# Altium footprint library JL_PCB.PCBLIB: 1112 footprints (part 69 of 71)
Each footprint in its own frame and in the unit in brackets; x right, y up, seen from the top. Pads: shape width x height; smd on the part's side, far side on the other; paste and mask are expansions set on the pad; w line width, h text height; cw(c..) or ccw(c..) is an arc to the next point about the centre after c.
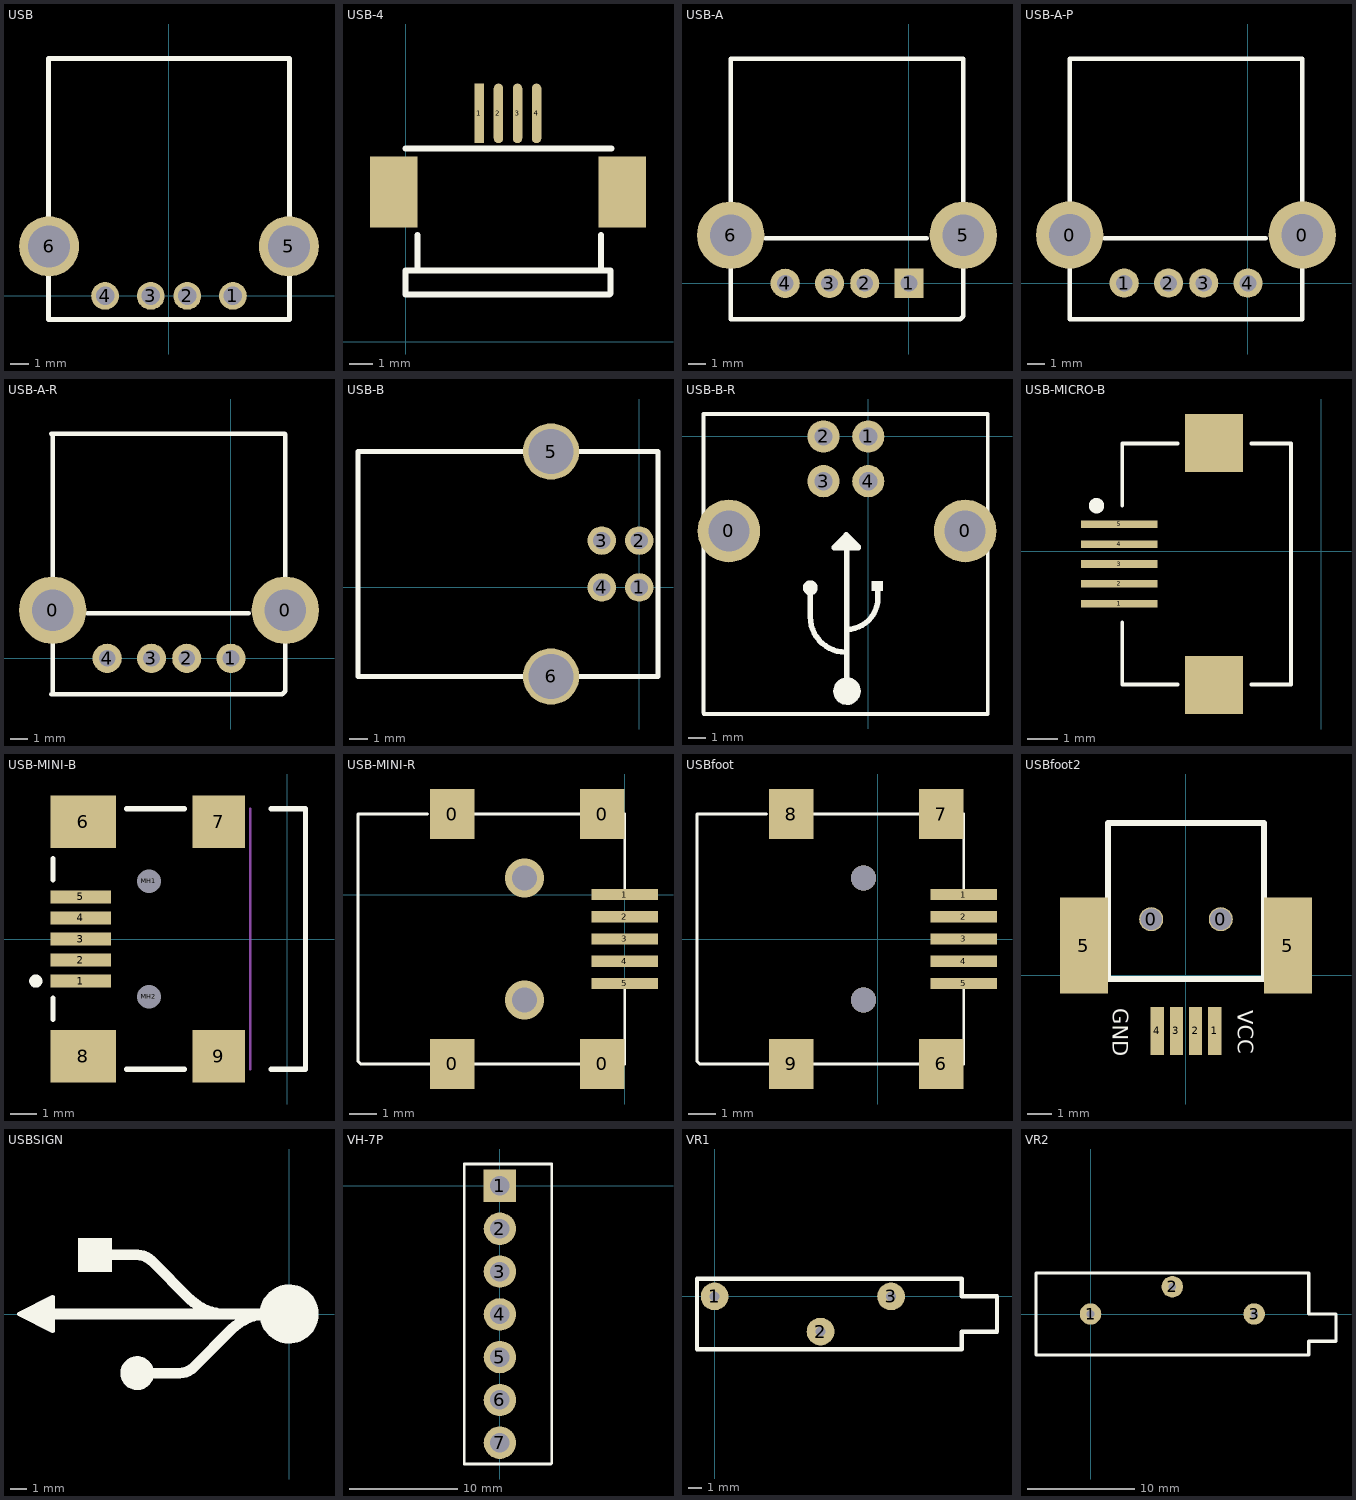
[diagram p68: the footprints below, top view; thin cyan lines are the x and y axes]

## USB [mm]
pads (6):
  round 1.524 hole 1: 1(3.503,0) 2(1.003,0) 3(-0.997,0) 4(-3.497,0)
  round 3.3 hole 2.3: 5(6.573,2.71) 6(-6.567,2.71)
TopOverlay:
  lines w0.254: -6.597,-1.295 6.603,-1.295 6.603,13.005 -6.597,13.005 -6.597,-1.295

## USB-4 [mm]
pads (6):
  rect 0.4x2.5 smd: 1(3.1,9.6)
  oval 0.4x2.5 smd: 2(3.9,9.6) 3(4.7,9.6) 4(5.5,9.6)
  rect 2x3 smd: ""(-0.5,6.3) ""(9.1,6.3)
TopOverlay:
  lines w0.254: 0,8.128 8.636,8.128 ; 0.5,3 0.5,4.5 ; 8.2,3 8.2,4.5 ; 0,2 0,3 8.6,3 8.6,2.036 8.564,2 0,2

## USB-A [mil]
pads (6):
  rect 65x65 hole 37: 1(0,0)
  round 65 hole 37: 2(-98.5,0) 3(-177,0) 4(-275.6,0)
  round 150 hole 93: 5(121,107) 6(-397,107)
TopOverlay:
  lines w10: -320,100 40,100 ; -397,-80 114,-80 121,-73 121,107 121,500 -397,500 -397,107 -397,-80
3D body "User Library-USB-A-01.step": height 274.23, standoff -164.75, extent -449.02,-45 173.02,494.37

## USB-A-P [mil]
pads (6):
  round 150 hole 93: 0(-397,107) 0(121,107)
  round 65 hole 37: 1(-275.6,0) 2(-177,0) 3(-98.5,0) 4(0,0)
TopOverlay:
  lines w10: -320,100 40,100 ; -397,-80 -397,107 -397,499 121,499 121,107 121,-80 -397,-80

## USB-A-R [mil]
pads (6):
  round 150 hole 93: 0(-397,107) 0(121,107)
  round 65 hole 37: 1(0,0) 2(-98.5,0) 3(-177,0) 4(-275.6,0)
TopOverlay:
  lines w10: -400,-80 114,-80 121,-73 121,107 121,499 120,500 -400,500 -397,497 -397,477 -397,107 -397,-77 ; -320,100 40,100

## USB-B [mm]
pads (6):
  round 1.524 hole 0.92: 1(0,0) 2(0,2.5) 3(-2,2.5) 4(-2,0)
  round 3 hole 2.4: 5(-4.7,7.25) 6(-4.7,-4.75)
TopOverlay:
  lines w0.254: -15,-4.75 1,-4.75 1,7.25 -15,7.25 -15,-4.75

## USB-B-R [mm]
pads (6):
  round 3.5 hole 2.3: 0(-7.789,-5.281) 0(5.411,-5.281)
  round 1.8 hole 1.016: 1(0,0) 2(-2.5,0) 3(-2.5,-2.5) 4(0,-2.5)
TopOverlay:
  rectangle: -1.514,-14.706 -0.814,-13.756
  rectangle: -3.339,-8.531 -3.139,-8.331
  rectangle: 0.186,-8.631 0.836,-8.081
  lines w0.203: -9.206,-15.432 -9.206,1.256 6.669,1.256 6.669,-15.508 ; -9.189,0.169 -9.189,-15.506 6.686,-15.506 6.686,0.169 ; -9.114,1.236 6.686,1.236
  lines w0.305: -3.239,-8.581 -3.239,-10.081 ccw(c-1.264,-10.081) -1.264,-12.056 ; -3.025,-8.605 cw(c-3.239,-8.456) -2.989,-8.532 ; -1.914,-6.206 -0.564,-6.206 -0.814,-5.956 -1.639,-5.956 ; -1.889,-6.181 -1.214,-5.506 -1.214,-13.981 ; -1.614,-13.906 ccw(c-1.214,-14.156) -1.564,-13.84 ; -1.516,-13.707 ccw(c-1.189,-14.231) -1.469,-13.681 ; -1.239,-5.756 -1.239,-5.481 -0.564,-6.156 ; -1.214,-10.781 ccw(c-1.214,-9.031) 0.536,-9.031 0.536,-8.681 ; -1.09,-13.979 ccw(c-1.264,-14.106) -1.05,-14.079

## USB-MICRO-B [mm] "Connector; USB2.0, Type A, SM; 5 Position; Right Angle"
height 3.9
pads (7):
  rect 2.5x0.25 smd: 1(-6.6,-1.719) 2(-6.6,-1.069) 3(-6.6,-0.419) 4(-6.6,0.231) 5(-6.6,0.881)
  rect 1.9x1.9 smd: ""(-3.505,-4.369) ""(-3.505,3.531)
TopOverlay:
  circle w0.25: c-7.348,1.486 r0.125
  lines w0.127: -6.508,-4.356 -4.7,-4.356 ; -6.508,-4.319 -6.508,-2.324 ; -6.508,1.486 -6.508,3.481 ; -6.508,3.518 -4.7,3.518 ; -2.286,-4.356 -1,-4.356 ; -2.286,3.518 -1,3.518 ; -1,-4.319 -1,3.481
3D body "Micro USB.STP": height 2.71, standoff -0.23, extent -6.358,-4.422 -0.928,3.558

## USB-MINI-B [mm] "Connector; USB2.0, Type A, SM; 5 Position; Right Angle"
height 3.9
pads (11):
  rect 2.3x0.5 smd: 1(-7.85,-1.6) 2(-7.85,-0.8) 3(-7.85,0) 4(-7.85,0.8) 5(-7.85,1.6)
  rect 2.5x2 smd: 6(-7.75,4.45) 8(-7.75,-4.45)
  rect 2x2 smd: 7(-2.6,4.45) 9(-2.6,-4.45)
  round 0.6 hole 0.9 unplated: MH1(-5.25,2.2) MH2(-5.25,-2.2)
TopOverlay:
  circle w0.25: c-9.55,-1.6 r0.125
  lines w0.2: -8.9,-3.05 -8.9,-2.25 ; -8.9,2.25 -8.9,3.05 ; -6.1,-4.95 -3.9,-4.95 ; -6.1,4.95 -3.9,4.95 ; -0.6,-4.95 0.7,-4.95 0.7,4.95 -0.6,4.95
Mechanical1:
  lines w0.1: -1.4,-4.95 -1.4,4.95
  text "PCB Edge" at 0.432,-4.036 h0.25
3D body "User Library-USB_mini_B.STEP": height 3.95, standoff -1, extent -8.55,-5.35 0.65,5.35

## USB-MINI-R [mm]
pads (9):
  rect 1.6x1.8 smd: 0(-6.2,-6.1) 0(-6.2,2.9) 0(-0.8,-6.1) 0(-0.8,2.9)
  rect 2.4x0.4 smd: 1(0,0) 2(0,-0.8) 3(0,-1.6) 4(0,-2.4) 5(0,-3.2)
via -3.6,0.6 diameter 1.4 hole 0.9
via -3.6,-3.8 diameter 1.4 hole 0.9
TopOverlay:
  lines w0.1: -7.1,2.9 -9.6,2.9 -9.6,-6 -9.5,-6.1 -7,-6.1 ; -5.4,-6.1 -1.6,-6.1 ; -5.4,2.9 -1.6,2.9 ; 0,-6.1 0,-3.4 ; 0,0.2 0,2.9

## USBfoot [mm]
pads (9):
  rect 2.4x0.4 smd: 1(3.1,1.6) 2(3.1,0.8) 3(3.1,0) 4(3.1,-0.8) 5(3.1,-1.6)
  rect 1.6x1.8 smd: 6(2.3,-4.5) 7(2.3,4.5) 8(-3.1,4.5) 9(-3.1,-4.5)
via -0.5,2.2 diameter 0.9 hole 0.9
via -0.5,-2.2 diameter 0.9 hole 0.9
TopOverlay:
  lines w0.1: -4,4.5 -6.5,4.5 -6.5,-4.4 -6.4,-4.5 -3.9,-4.5 ; -2.3,-4.5 1.5,-4.5 ; -2.3,4.5 1.5,4.5 ; 3.1,-4.5 3.1,-1.8 ; 3.1,1.8 3.1,4.5

## USBfoot2 [mm]
pads (8):
  round 1 hole 0.9: 0(-1.45,2.325) 0(1.45,2.325)
  rect 0.55x2 smd: 1(1.2,-2.325) 2(0.4,-2.325) 3(-0.4,-2.325) 4(-1.2,-2.325)
  rect 2x4 smd: 5(-4.25,1.225) 5(4.25,1.225)
TopOverlay:
  lines w0.254: -3.25,-0.175 -3.25,6.325 3.25,6.325 3.25,-0.175 -3.25,-0.175
  text "VCC" at 2.15,-1.475 h0.64
  text "GND" at -3.05,-1.375 h0.64

## USBSIGN [mil]
TopOverlay:
  circle w40: c-360,-140 r20
  circle w60: c0,0 r40
  region: -420,180 -500,180 -500,100 -420,100
  lines w10: -600,1 -578,19 -580,0 -609,6 -577,-18 -569,24 -619,1 -569,-25 -569,31 -628,1 -560,-33 ; -640,0 -560,40 -560,-40 -640,0
  lines w25: -580,0 -340,0 0,0 -50,0 ccw(c-50,-120.71) -135.36,-35.36 -225.86,-125.86 cw(c-260,-91.72) -260,-140 -340,-140 ; -440,140 -360,140 cw(c-360,91.72) -325.86,125.86 -235.35,35.35 ccw(c-150,120.71) -150,0 -120,0 ; -320,-140 -310,-140 ; -170,0 -100,0

## VH-7P [mm]
pads (7):
  rect 3x3 hole 1.8: 1(0,0)
  round 3 hole 1.8: 2(0,-3.96) 3(0,-7.92) 4(0,-11.88) 5(0,-15.84) 6(0,-19.8) 7(0,-23.76)
TopOverlay:
  rectangle: -3.296,2.032 -1.096,2.032
  lines w0.254: -3.296,-25.728 -3.296,2.032 4.804,2.032 4.804,-25.628 4.704,-25.728 -3.296,-25.728

## VR1 [mm]
pads (3):
  round 2 hole 0.711: 1(0,0) 2(7.62,-2.54) 3(12.7,0)
TopOverlay:
  lines w0.305: -1.27,-3.81 -1.27,1.27 17.78,1.27 17.78,0 20.32,0 20.32,-2.54 17.78,-2.54 17.78,-3.81 -1.27,-3.81

## VR2 [mm]
pads (3):
  round 2 hole 0.711: 1(0,0) 2(7.62,2.54) 3(15.24,0)
TopOverlay:
  lines w0.305: -5.08,-3.81 -5.08,3.81 20.32,3.81 20.32,0 22.86,0 22.86,-2.54 20.32,-2.54 20.32,-3.81 -5.08,-3.81